# Altium footprint library LTEWlib.PcbLib: 125 footprints (part 4 of 8)
Each footprint in its own frame and in the unit in brackets; x right, y up, seen from the top. Pads: shape width x height; smd on the part's side, far side on the other; paste and mask are expansions set on the pad; w line width, h text height; cw(c..) or ccw(c..) is an arc to the next point about the centre after c.
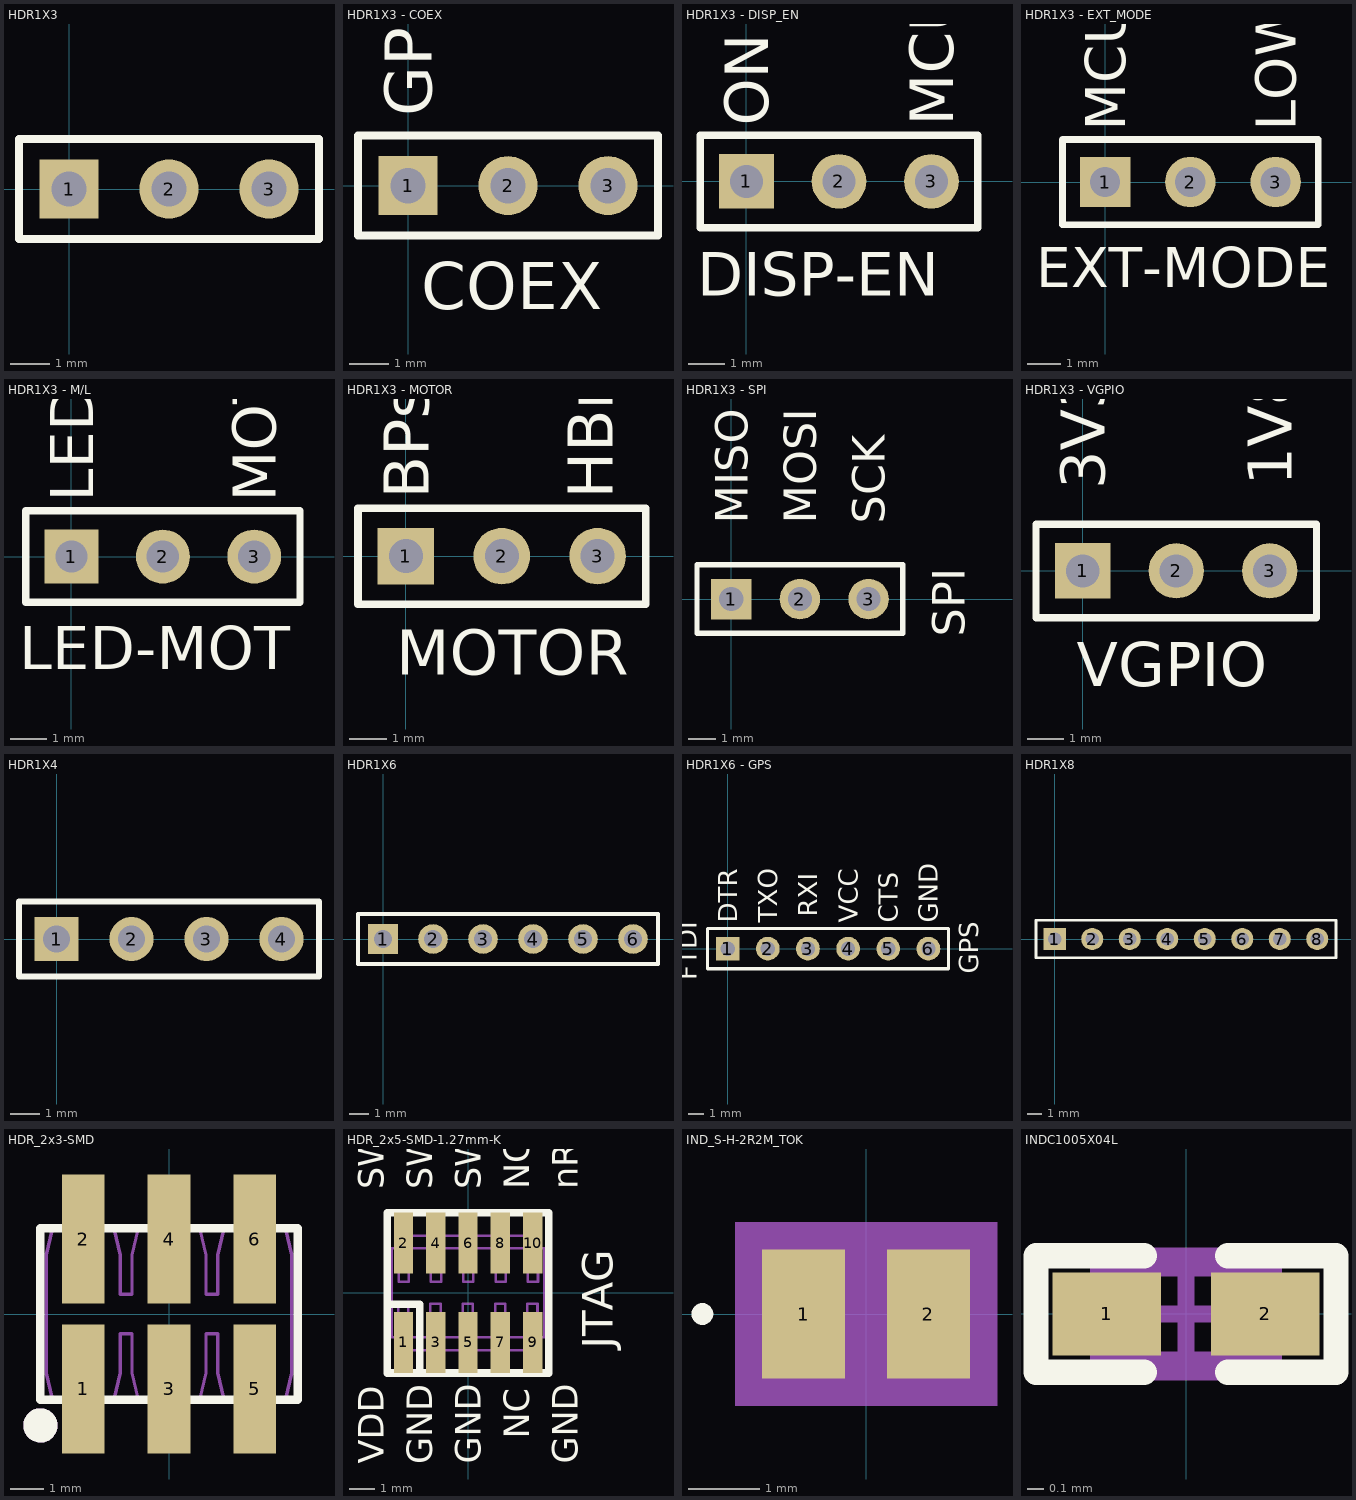
[diagram p3: the footprints below, top view; thin cyan lines are the x and y axes]

## HDR1X3 [mm] "Connector; Header; 3 Position"
pads (3):
  rect 1.5x1.5 hole 0.9: 1(0,0)
  round 1.5 hole 0.9: 2(2.54,0) 3(5.08,0)
Top Overlay:
  lines w0.2: -1.27,-1.27 -1.27,1.27 6.35,1.27 6.35,-1.27 -1.27,-1.27

## HDR1X3 - COEX [mm] "Connector; Header; 3 Position"
pads (3):
  rect 1.5x1.5 hole 0.9: 1(0,0)
  round 1.5 hole 0.9: 2(2.54,0) 3(5.08,0)
Top Overlay:
  lines w0.2: -1.27,-1.27 -1.27,1.27 6.35,1.27 6.35,-1.27 -1.27,-1.27
  text "GPSEN" at 0.6,1.768 h1.2
  text "COEX" at 0.341,-3.14 h1.2

## HDR1X3 - DISP_EN [mm] "Connector; Header; 3 Position"
pads (3):
  rect 1.5x1.5 hole 0.9: 1(0,0)
  round 1.5 hole 0.9: 2(2.54,0) 3(5.08,0)
Top Overlay:
  lines w0.2: -1.27,-1.27 6.35,-1.27 6.35,1.27 -1.27,1.27 -1.27,-1.27
  text "DISP-EN" at -1.359,-3.14 h1.2
  text "MCU" at 5.68,1.524 h1.2
  text "ON" at 0.6,1.524 h1.2

## HDR1X3 - EXT_MODE [mm] "Connector; Header; 3 Position"
pads (3):
  rect 1.5x1.5 hole 0.9: 1(0,0)
  round 1.5 hole 0.9: 2(2.54,0) 3(5.08,0)
Top Overlay:
  lines w0.2: -1.27,-1.27 -1.27,1.27 6.35,1.27 6.35,-1.27 -1.27,-1.27
  text "MCU" at 0.6,1.524 h1.2
  text "LOW" at 5.68,1.524 h1.2
  text "EXT-MODE" at -2.059,-3.14 h1.2

## HDR1X3 - M/L [mm] "Connector; Header; 3 Position"
pads (3):
  rect 1.5x1.5 hole 0.9: 1(0,0)
  round 1.5 hole 0.9: 2(2.54,0) 3(5.08,0)
Top Overlay:
  lines w0.2: -1.27,-1.27 -1.27,1.27 6.35,1.27 6.35,-1.27 -1.27,-1.27
  text "LED" at 0.6,1.524 h1.2
  text "MOT" at 5.68,1.524 h1.2
  text "LED-MOT" at -1.459,-3.14 h1.2

## HDR1X3 - MOTOR [mm] "Connector; Header; 3 Position"
pads (3):
  rect 1.5x1.5 hole 0.9: 1(0,0)
  round 1.5 hole 0.9: 2(2.54,0) 3(5.08,0)
Top Overlay:
  lines w0.2: -1.27,-1.27 -1.27,1.27 6.35,1.27 6.35,-1.27 -1.27,-1.27
  text "BPss" at 0.6,1.524 h1.2
  text "HBrdg" at 5.48,1.524 h1.2
  text "MOTOR" at -0.259,-3.14 h1.2

## HDR1X3 - SPI [mm] "Connector; Header; 3 Position"
pads (3):
  rect 1.5x1.5 hole 0.9: 1(0,0)
  round 1.5 hole 0.9: 2(2.54,0) 3(5.08,0)
Top Overlay:
  lines w0.2: -1.27,-1.27 6.35,-1.27 6.35,1.27 -1.27,1.27 -1.27,-1.27
  text "SCK" at 5.68,2.794 h1.2
  text "MOSI" at 3.14,2.794 h1.2
  text "SPI" at 8.636,-1.4 h1.2
  text "MISO" at 0.6,2.794 h1.2

## HDR1X3 - VGPIO [mm] "Connector; Header; 3 Position"
pads (3):
  rect 1.5x1.5 hole 0.9: 1(0,0)
  round 1.5 hole 0.9: 2(2.54,0) 3(5.08,0)
Top Overlay:
  lines w0.2: -1.27,-1.27 6.35,-1.27 6.35,1.27 -1.27,1.27 -1.27,-1.27
  text "VGPIO" at -0.159,-3.14 h1.2
  text "1V8" at 5.68,2.31 h1.2
  text "3V3" at 0.6,2.211 h1.2

## HDR1X4 [mm] "Connector; Header; 3 Position"
pads (4):
  rect 1.5x1.5 hole 0.9: 1(0,0)
  round 1.5 hole 0.9: 2(2.54,0) 3(5.08,0) 4(7.62,0)
Top Overlay:
  lines w0.2: -1.27,-1.27 8.89,-1.27 8.89,1.27 -1.27,1.27 -1.27,-1.27

## HDR1X6 [mm] "Connector; Header; 3 Position"
pads (6):
  rect 1.5x1.5 hole 0.9: 1(0,0)
  round 1.5 hole 0.9: 2(2.54,0) 3(5.08,0) 4(7.62,0) 5(10.16,0) 6(12.7,0)
Top Overlay:
  lines w0.2: -1.27,-1.27 -1.27,1.27 13.97,1.27 13.97,-1.27 -1.27,-1.27

## HDR1X6 - GPS [mm] "Connector; Header; 3 Position"
pads (6):
  rect 1.5x1.5 hole 0.9: 1(0,0)
  round 1.5 hole 0.9: 2(2.54,0) 3(5.08,0) 4(7.62,0) 5(10.16,0) 6(12.7,0)
Top Overlay:
  lines w0.2: -1.27,-1.27 13.97,-1.27 13.97,1.27 -1.27,1.27 -1.27,-1.27
  text "FTDI" at -1.94,-1.999 h1.2
  text "GPS" at 15.84,-1.599 h1.2
  text "DTR" at 0.6,1.627 h1.2
  text "TXO" at 3.14,1.627 h1.2
  text "RXI" at 5.68,2.027 h1.2
  text "VCC" at 8.22,1.627 h1.2
  text "CTS" at 10.76,1.627 h1.2
  text "GND" at 13.3,1.627 h1.2

## HDR1X8 [mm] "Connector; Header; 3 Position"
pads (8):
  rect 1.5x1.5 hole 0.9: 1(0,0)
  round 1.5 hole 0.9: 2(2.54,0) 3(5.08,0) 4(7.62,0) 5(10.16,0) 6(12.7,0) 7(15.24,0) 8(17.78,0)
Top Overlay:
  lines w0.2: -1.27,-1.27 -1.27,1.27 19.05,1.27 19.05,-1.27 -1.27,-1.27

## HDR_2x3-SMD [mil]
pads (6):
  rect 50x150 smd: 1(-100,-87.5) 2(-100,87.5) 3(0,-87.5) 4(0,87.5) 5(100,-87.5) 6(100,87.5)
Top Overlay:
  circle w20: c-150,-130 r10
  lines w10: -150,-100 150,-100 150,100 -150,100 -150,-100
Mechanical 7:
  circle w20: c-150,-130 r10
  lines w3.94: -113.78,-98.43 -113.78,-119.75 ccw(c-100,-119.75) -86.22,-119.75 -86.22,-98.43 ; -113.78,98.43 -113.78,119.75 cw(c-100,119.75) -86.22,119.75 -86.22,98.43 ; -13.78,-98.43 -13.78,-119.75 ccw(c0,-119.75) 13.78,-119.75 13.78,-98.43 ; -13.78,98.43 -13.78,119.75 cw(c0,119.75) 13.78,119.75 13.78,98.43 ; 86.22,-98.43 86.22,-119.75 ccw(c100,-119.75) 113.78,-119.75 113.78,-98.43 ; 86.22,98.43 86.22,119.75 cw(c100,119.75) 113.78,119.75 113.78,98.43 ; -143.11,-68.71 -136.22,-98.43 -63.78,-98.43 -56.89,-68.71 -56.89,-22.88 -43.11,-22.88 -43.11,-68.71 -36.22,-98.43 36.22,-98.43 43.11,-68.71 43.11,-22.88 56.89,-22.88 56.89,-68.71 63.78,-98.43 136.22,-98.43 143.11,-68.71 143.11,68.71 136.22,98.43 63.78,98.43 56.89,68.71 56.89,22.88 43.11,22.88 43.11,68.71 36.22,98.43 -36.22,98.43 -43.11,68.71 -43.11,22.88 -56.89,22.88 -56.89,68.71 -63.78,98.43 -136.22,98.43 -143.11,68.71 -143.11,-68.71 ; -111.81,-61.81 -88.19,-61.81 -88.19,-38.19 -111.81,-38.19 -111.81,-61.81 ; -111.81,38.19 -88.19,38.19 -88.19,61.81 -111.81,61.81 -111.81,38.19 ; -11.81,-61.81 -11.81,-38.19 11.81,-38.19 11.81,-61.81 -11.81,-61.81 ; -11.81,38.19 -11.81,61.81 11.81,61.81 11.81,38.19 -11.81,38.19 ; 88.19,-61.81 88.19,-38.19 111.81,-38.19 111.81,-61.81 88.19,-61.81 ; 88.19,38.19 88.19,61.81 111.81,61.81 111.81,38.19 88.19,38.19
  text ".Designator" at -66.93,-15.75 h27
3D body "pin_header_a-sl254-dg-g06mp1.stp": height 382.03, standoff -1.57, extent -149.99,-147.63 150.01,147.64

## HDR_2x5-SMD-1.27mm-K [mm]
pads (10):
  rect 0.76x2.4 smd: 1(-2.54,-1.95) 2(-2.54,1.95) 3(-1.27,-1.95) 4(-1.27,1.95) 5(0,-1.95) 6(0,1.95) 7(1.27,-1.95) 8(1.27,1.95) 9(2.54,-1.95) 10(2.54,1.95)
Top Overlay:
  lines w0.3: -3.175,-0.45 -1.9,-0.45 -1.9,-3.15 ; -3.175,-3.15 3.175,-3.15 3.175,3.15 -3.175,3.15 -3.175,-3.15
  text "VDD" at -3.31,-6.73 h1
  text "GND" at 0.5,-6.73 h1
  text "SWDIO" at -3.31,4.064 h1
  text "SWDCLK" at -1.405,4.064 h1
  text "SWO" at 0.5,4.064 h1
  text "nRESET" at 4.31,4.064 h1
  text "NC" at 2.405,4.064 h1
  text "NC" at 2.405,-5.73 h1
  text "GND" at -1.405,-6.73 h1
  text "GND" at 4.31,-6.73 h1
  text "JTAG" at 5.68,-2.199 h1.2
Mechanical 7:
  lines w0.1: -2.74,-1.75 -2.74,-2.459 ccw(c-2.54,-2.459) -2.34,-2.459 -2.34,-2.25 ; -2.74,1.75 -2.74,2.459 cw(c-2.54,2.459) -2.34,2.459 -2.34,2.25 ; -2.5,-1.75 -2.5,-2.25 -1.25,-2.25 ; -2.5,1.75 -2.5,2.25 2.5,2.25 2.5,1.75 ; -1.47,-2.25 -1.47,-2.459 ccw(c-1.27,-2.459) -1.07,-2.459 -1.07,-2.25 ; -1.47,2.25 -1.47,2.459 cw(c-1.27,2.459) -1.07,2.459 -1.07,2.25 ; -1.25,-1.75 -1.25,-2.25 ; -0.2,-2.25 -0.2,-2.459 ccw(c0,-2.459) 0.2,-2.459 0.2,-2.25 ; -0.2,2.25 -0.2,2.459 cw(c0,2.459) 0.2,2.459 0.2,2.25 ; 1.07,-2.25 1.07,-2.459 ccw(c1.27,-2.459) 1.47,-2.459 1.47,-2.25 ; 1.07,2.25 1.07,2.459 cw(c1.27,2.459) 1.47,2.459 1.47,2.25 ; 1.25,-1.75 1.25,-2.25 ; 2.34,-2.25 2.34,-2.459 ccw(c2.54,-2.459) 2.74,-2.459 2.74,-1.75 ; 2.34,2.25 2.34,2.459 cw(c2.54,2.459) 2.74,2.459 2.74,1.75 ; 2.5,-1.75 2.5,-2.25 1.25,-2.25 ; -1.25,-2.25 1.25,-2.25 ; -3,-1.75 3,-1.75 3,1.75 -3,1.75 -3,-1.75 ; -2.75,-0.835 -2.35,-0.835 -2.35,-0.435 -2.75,-0.435 -2.75,-0.835 ; -2.73,0.435 -2.33,0.435 -2.33,0.835 -2.73,0.835 -2.73,0.435 ; -1.48,-0.835 -1.08,-0.835 -1.08,-0.435 -1.48,-0.435 -1.48,-0.835 ; -1.46,0.435 -1.06,0.435 -1.06,0.835 -1.46,0.835 -1.46,0.435 ; -0.21,-0.835 0.19,-0.835 0.19,-0.435 -0.21,-0.435 -0.21,-0.835 ; -0.19,0.435 0.21,0.435 0.21,0.835 -0.19,0.835 -0.19,0.435 ; 1.06,-0.835 1.46,-0.835 1.46,-0.435 1.06,-0.435 1.06,-0.835 ; 1.08,0.435 1.48,0.435 1.48,0.835 1.08,0.835 1.08,0.435 ; 2.33,-0.835 2.73,-0.835 2.73,-0.435 2.33,-0.435 2.33,-0.835 ; 2.35,0.435 2.75,0.435 2.75,0.835 2.35,0.835 2.35,0.435
  text ".Designator" at -0.8,-0.2 h0.38
3D body "Samtec-FTSH-105-01-F-DV-K.step": height 6.11, standoff -0.01, extent -3.137,-2.921 3.137,2.921

## IND_S-H-2R2M_TOK [mil]
pads (2):
  rect 45.78x71 smd paste+0 mask+0: 1(-34.39,0) 2(34.39,0)
Top Overlay:
  circle w6: c-90.28,0 r3
Mechanical 5:
  region: 72.28,-50.5 -72.28,-50.5 -72.28,50.5 72.28,50.5
Mechanical 13:
  circle w0: c-29.39,0 r3
  lines w1: -43.5,-35.5 -43.5,35.5 ; -43.5,-35.5 -11.5,-35.5 -11.5,35.5 -43.5,35.5 ; -43.5,-35.5 43.5,-35.5 ; -43.5,-35.5 -43.5,35.5 ; -43.5,35.5 43.5,35.5 ; 43.5,-35.5 11.5,-35.5 11.5,35.5 43.5,35.5 ; 43.5,-35.5 43.5,35.5 ; 43.5,-35.5 43.5,35.5
Mechanical 15:
  region: 67.28,-45.5 -67.28,-45.5 -67.28,45.5 67.28,45.5
  lines w6: -67.28,-45.5 -67.28,45.5 67.28,45.5 67.28,-45.5 -67.28,-45.5
3D body "IND_S-H-2R2M_TOK.step": height 47.01, standoff 0, extent -43.5,-35.51 43.5,35.51

## INDC1005X04L [mm]
pads (2):
  rect 0.65x0.5 smd: 1(-0.475,0) 2(0.475,0)
Top Overlay:
  lines w0.152: -0.25,-0.35 -0.9,-0.35 -0.9,0.35 -0.25,0.35 ; 0.25,-0.35 0.9,-0.35 0.9,0.35 0.25,0.35
Mechanical 7:
  lines w0.1: -0.525,-0.275 0.525,-0.275 0.525,0.275 -0.525,0.275 -0.525,-0.275
  text ".Designator" at -0.432,-0.152 h0.3
Mechanical 15:
  lines w0.1: -0.275,0 0.275,0 ; 0,-0.275 0,0.275 ; -0.9,-0.35 0.9,-0.35 0.9,0.35 -0.9,0.35 -0.9,-0.35
3D body "User Library-Chip Inductor 0402.step": height 0.5, standoff 0, extent -0.5,-0.3 0.5,0.3